# Altium schematic symbol library 13-Logic 数字 IC.SchLib: 324 symbols (part 13 of 30) (continued)
## TMS320F28335ZJZS_a
designator IC?
32-Bit 150MHz Digital Signal Processor (DSP)
part A pins: A8 ~{XRD} (out), A10 XCLKOUT (out), G13 XCLKIN (in), G14 X1 (in), H14 X2 (out), K1 ADCINA7 (in), K2 ADCINA6 (in), L1 ADCINA5 (in), L2 ADCINA4 (in), L3 ADCINA3 (in), L7 TEST2 (io), L11 ~{TRST} (in), M1 ADCINA2 (in), M2 ADCINA1 (in), M3 ADCINA0 (in), M4 ADCINB2 (in), M5 ADCINB4 (in), M6 ADCINB6 (in), M7 TEST1 (io), M12 TMS (in), M13 ~{XRS} (io), M14 TCK (in), N2 ADCLO (in), N3 ADCINB1 (in), N4 ADCINB3 (in), N5 ADCINB5 (in), N6 ADCINB7 (in), N7 EMU0 (io), N12 TDI (in), N13 TDO (out), P3 ADCINB0 (in), P4 ADCREFM (out), P5 ADCREFP (out), P6 ADCRESEXT (out), P7 ADCREFIN (out), P8 EMU1 (io)
part B pins: A6 GPIO44/XA4 (io), A7 GPIO41/XA1 (io), A9 GPIO34/ECAP1/XREADY (io), B2 GPIO31/CANTXA/XA17 (io), B6 GPIO45/XA5 (io), B7 GPIO42/XA2 (io), B8 GPIO37/ECAP2/~{XZCS7} (io), B9 GPIO35/SCITXDA/XR/~{W} (io), C1 GPIO29/SCITXDA/XA19 (io), C2 GPIO30/CANRXA/XA18 (io), C3 GPIO39/XA16 (io), C6 GPIO46/XA6 (io), C7 GPIO43/XA3 (io), C8 GPIO40/XA0/~{XWE1} (io), C9 GPIO36/SCIRXDA/~{XZCS0} (io), C10 GPIO38/~{XWE0} (io), D1 GPIO0/EPWM1A (io), D2 GPIO1/EPWM1B/ECAP6/MFSRB (io), D3 GPIO2/EPWM2A, D6 GPIO47/XA7 (io), D10 GPIO28/SCIRXDA/~{XZCS6} (io), E1 GPIO3/EPWM2B/ECAP5/MCLKRB (io), E2 GPIO4/EPWM3A (io), E3 GPIO5/EPWM3B/MFSRA/ECAP1 (io), F1 GPIO6/EPWM4A/EPWMSYNCI/EPWMSYNCO (io), F2 GPIO7/EPWM4B/MCLKRA/ECAP2 (io), F3 GPIO8/EPWM5A/CANTXB/~{ADCSOCAO} (io), G1 GPIO9/EPWM5B/SCITXDB/ECAP3 (io), G2 GPIO10/EPWM6A/CANRXB/~{ADCSOCBO} (io), G3 GPIO11/EPWM6B/SCIRXDB/ECAP4 (io), H1 GPIO12/~{TZ1}/CANTXB/MDXB (io), H2 GPIO13/~{TZ2}/CANRXB/MDRB (io), H3 GPIO14/~{TZ3}/~{XHOLD}/SCITXDB/MCLKXB (io), J1 GPIO15/~{TZ4}/~{XHOLDA}/SCIRXDB/MFSXB (io), J2 GPIO16/SPISIMOA/CANTXB/~{TZ5} (io), J3 GPIO17/SPISOMIA/CANRXB/~{TZ6} (io), L13 GPIO49/ECAP6/XD30 (io), L14 GPIO48/ECAP5/XD31 (io), M8 GPIO19/~{SPISTEA}/SCIRXDB/CANTXA (io), M9 GPIO22/EQEP1S/MCLKXA/SCITXDB (io), M10 GPIO25/ECAP2/EQEP2B/MDRB (io), M11 GPIO32/SDAA/EPWMSYNCI/~{ADSOCAO} (io), N8 GPIO18/SPICLKA/SCITXDB/CANRXA (io), N9 GPIO21/EQEP1B/MDRA/CANRXB (io), N10 GPIO24/ECAP1/EQEP2A/MDXB (io), N11 GPIO27/ECAP4/EQEP2S/MFSXB (io), P9 GPIO20/EQEP1A/MDXA/CANTXB (io), P10 GPIO23/EQEP1I/MFSXA/SCIRXDB (io), P11 GPIO26/ECAP3/EQEP2I/MCLKXB (io), P12 GPIO33/SCLA/EPWMSYNCO/~{ADCSOCBO} (io)
part C pins: A3 GPIO86/XA14 (io), A4 GPIO83/XA11 (io), A5 GPIO80/XA8 (io), A11 GPIO76/XD3 (io), A12 GPIO73/XD6 (io), B3 GPIO87/XA15 (io), B4 GPIO84/XA12 (io), B5 GPIO81/XA9 (io), B10 GPIO79/XD0 (io), B11 GPIO77/XD2 (io), B12 GPIO74/XD5 (io), B13 GPIO72/XD7 (io), C4 GPIO85/XA13 (io), C5 GPIO82/XA10 (io), C11 GPIO78/XD1 (io), C12 GPIO75/XD4 (io), C13 GPIO71/XD8 (io), C14 GPIO70/XD9 (io), D12 GPIO69/XD10 (io), D13 GPIO68/XD11 (io), D14 GPIO67/XD12 (io), E12 GPIO66/XD13 (io), E13 GPIO65/XD14 (io), E14 GPIO64/XD15 (io), F12 GPIO63/SCITXDC/XD16 (io), F13 GPIO62/SCIRXDC/XD17 (io), F14 GPIO61/MFSRB/XD18 (io), G12 GPIO60/MCLKRB/XD19 (io), H11 GPIO59/MFSRA/XD20 (io), H12 GPIO58/MCLKRA/XD21 (io), H13 GPIO57/~{SPISTEA}/XD22 (io), J12 GPIO56/SPICLKA/XD23 (io), J13 GPIO55/SPISOMIA/XD24 (io), J14 GPIO54/SPISIMOA/XD25 (io), K12 GPIO53/EQEP1I/XD26 (io), K13 GPIO52/EQEP1S/XD27 (io), K14 GPIO51/EQEP1B/XD28 (io), L12 GPIO50/EQEP1A/XD29 (io)
part D pins: A1 VSS (power), A2 VSS (power), A13 VDDIO (power), A14 VSS (power), B1 VDDIO (power), B14 VSS (power), D4 VDD (power), D5 VDD (power), D7 VDDIO (power), D8 VDD (power), D9 VDD (power), D11 VDDIO (power), E4 VDDIO (power), E11 VDD (power), F4 VDD (power), F6 VSS (power), F7 VSS (power), F8 VSS (power), F9 VSS (power), F11 VDD (power), G4 VDDIO (power), G6 VSS (power), G7 VSS (power), G8 VSS (power), G9 VSS (power), G11 VDDIO (power), H4 VDD (power), H6 VSS (power), H7 VSS (power), H8 VSS (power), H9 VSS (power), J4 VDD (power), J6 VSS (power), J7 VSS (power), J8 VSS (power), J9 VSS (power), J11 VDD (power), K3 VDD1A18 (out), K4 VDDA2 (power), K11 VDD (power), L4 VSS1AGND (power), L5 VDDAIO (power), L6 VDD2A18 (power), L8 VDD (power), L9 VDD3VFL (power), L10 VDDIO (power), N1 VSSAIO (power), N14 VDDIO (power), P1 VSSA2 (power), P2 VSS2AGND (power), P13 VSS (power), P14 VSS (power)

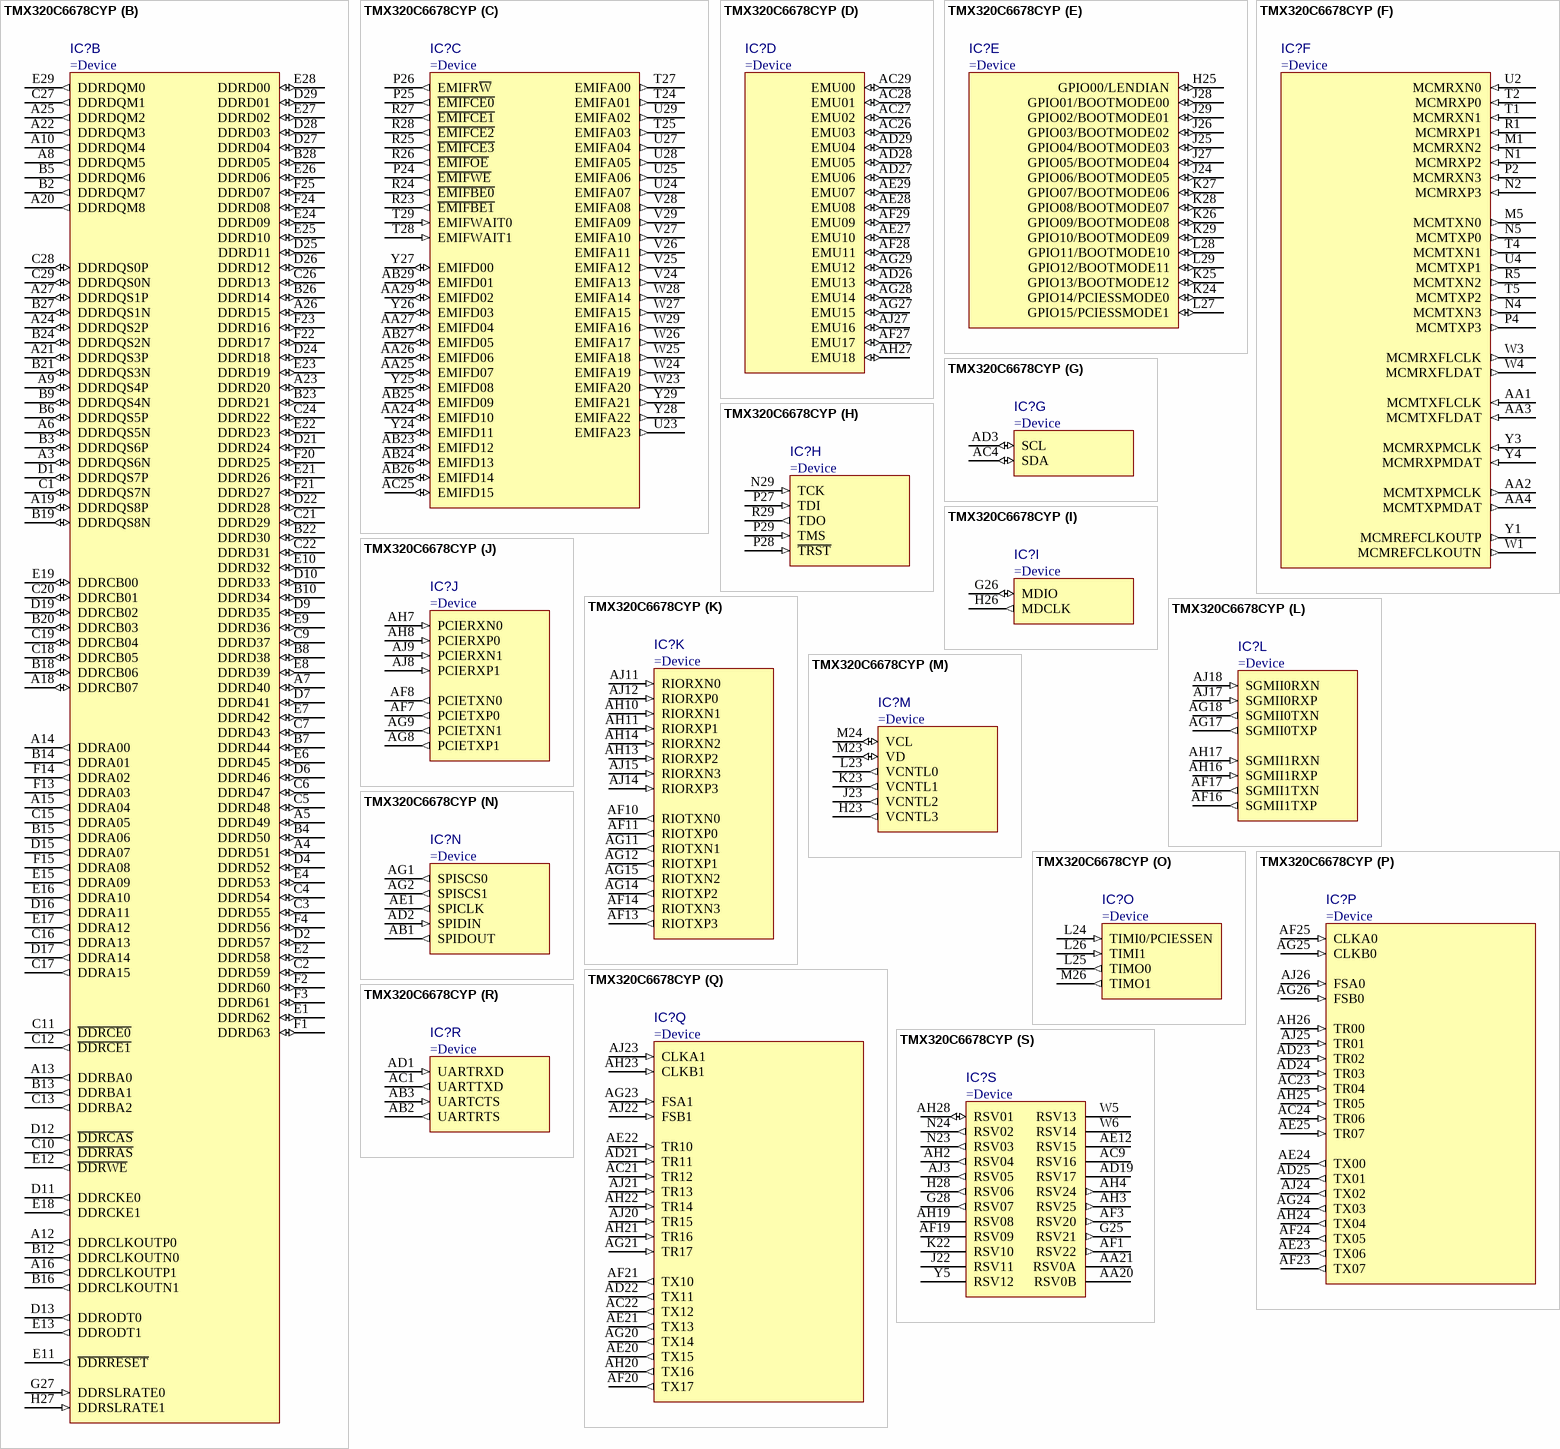
[diagram p82: symbol TMX320C6678CYP]

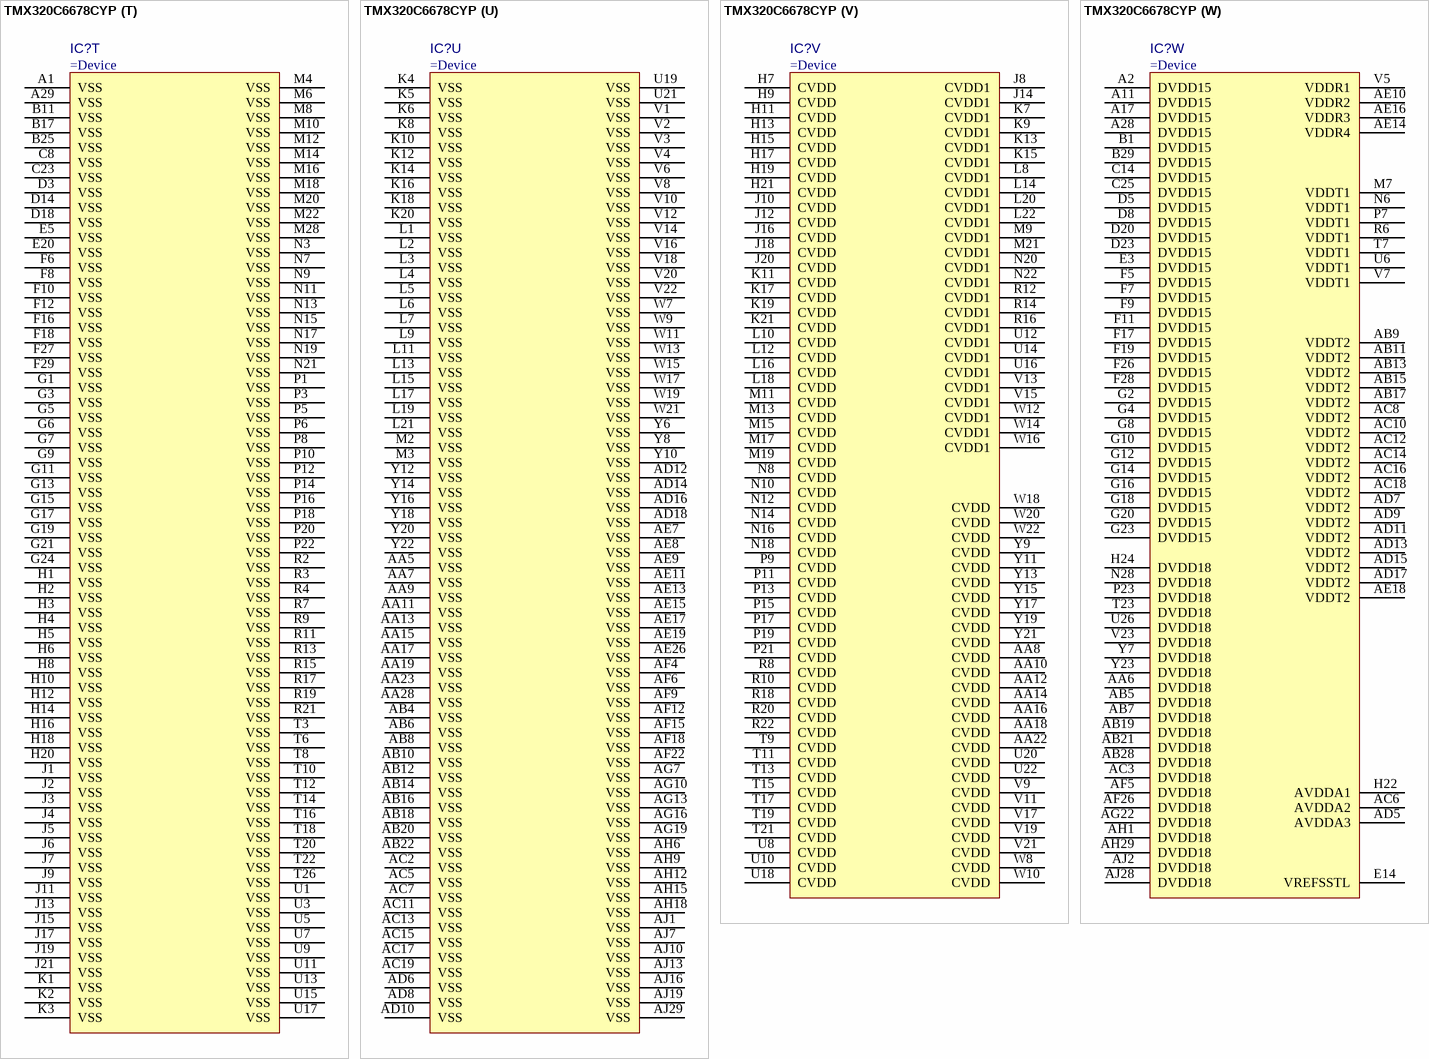
[diagram p83: symbol TMX320C6678CYP]

## TMX320C6678CYP
designator IC?
Multicore Fixed and Floating-Point Digital Signal Processor
part A pins: AC20 ~{POR} (in), AD4 CORESEL1 (in), AD20 HOUT (out), AE2 BOOTCOMPLETE (out), AE3 SYSCLKOUT (out), AE4 PACLKSEL (in), AE5 CORESEL3 (in), AE6 CORESEL2 (in), AF2 CORESEL0 (in), AG3 CORECLKP (in), AG4 CORECLKN (in), AG5 PCIECLKP (in), AG6 SRIOSGMIICLKP (in), AH5 PCIECLKN (in), AJ4 PASSCLKN (in), AJ5 PASSCLKP (in), AJ6 SRIOSGMIICLKN (in), G22 PTV15 (in), G29 DDRCLKP (in), H29 DDRCLKN (in), M25 ~{NMI} (in), M27 ~{LRESETNMIEN} (in), M29 ~{RESET} (in), N25 ~{RESETFULL} (in), N26 ~{LRESET} (in), N27 ~{RESETSTAT} (out), W2 MCMCLKP (in), Y2 MCMCLKN (in)
part B pins: A3 DDRDQS6N (io), A4 DDRD51 (io), A5 DDRD49 (io), A6 DDRDQS5N (io), A7 DDRD40 (io), A8 DDRDQM5 (out), A9 DDRDQS4P (io), A10 DDRDQM4 (out), A12 DDRCLKOUTP0 (out), A13 DDRBA0 (out), A14 DDRA00 (out), A15 DDRA04 (out), A16 DDRCLKOUTP1 (out), A18 DDRCB07 (io), A19 DDRDQS8P (io), A20 DDRDQM8 (out), A21 DDRDQS3P (io), A22 DDRDQM3 (out), A23 DDRD20 (io), A24 DDRDQS2P (io), A25 DDRDQM2 (out), A26 DDRD15 (io), A27 DDRDQS1P (io), B2 DDRDQM7 (out), B3 DDRDQS6P (io), B4 DDRD50 (io), B5 DDRDQM6 (out), B6 DDRDQS5P (io), B7 DDRD44 (io), B8 DDRD38 (io), B9 DDRDQS4N (io), B10 DDRD34 (io), B12 DDRCLKOUTN0 (out), B13 DDRBA1 (out), B14 DDRA01 (out), B15 DDRA06 (out), B16 DDRCLKOUTN1 (out), B18 DDRCB06 (io), B19 DDRDQS8N (io), B20 DDRCB03 (io), B21 DDRDQS3N (io), B22 DDRD30 (io), B23 DDRD21 (io), B24 DDRDQS2N (io), B26 DDRD14 (io), B27 DDRDQS1N (io), B28 DDRD05 (io), C1 DDRDQS7N (io), C2 DDRD59 (io), C3 DDRD55 (io), C4 DDRD54 (io), C5 DDRD48 (io), C6 DDRD47 (io), C7 DDRD43 (io), C9 DDRD37 (io), C10 ~{DDRRAS} (out), C11 ~{DDRCE0} (out), C12 ~{DDRCE1} (out), C13 DDRBA2 (out), C15 DDRA05 (out), C16 DDRA13 (out), C17 DDRA15 (out), C18 DDRCB05 (io), C19 DDRCB04 (io), C20 DDRCB01 (io), C21 DDRD29 (io), C22 DDRD31 (io), C24 DDRD22 (io), C26 DDRD13 (io), C27 DDRDQM1 (out), C28 DDRDQS0P (io), C29 DDRDQS0N (io), D1 DDRDQS7P (io), D2 DDRD57 (io), D4 DDRD52 (io), D6 DDRD46 (io), D7 DDRD41 (io), D9 DDRD35 (io), D10 DDRD33 (io), D11 DDRCKE0 (out), D12 ~{DDRCAS} (out), D13 DDRODT0 (out), D15 DDRA07 (out), D16 DDRA11 (out), D17 DDRA14 (out), D19 DDRCB02 (io), D21 DDRD24 (io), D22 DDRD28 (io), D24 DDRD18 (io), D25 DDRD11 (io), D26 DDRD12 (io), D27 DDRD04 (io), D28 DDRD03 (io), D29 DDRD01 (io), E1 DDRD62 (io), E2 DDRD58 (io), E4 DDRD53 (io), E6 DDRD45 (io), E7 DDRD42 (io), E8 DDRD39 (io), E9 DDRD36 (io), E10 DDRD32 (io), E11 ~{DDRRESET} (out), E12 ~{DDRWE} (out), E13 DDRODT1 (out), E15 DDRA09 (out), E16 DDRA10 (out), E17 DDRA12 (out), E18 DDRCKE1 (out), E19 DDRCB00 (io), E21 DDRD26 (io), E22 DDRD23 (io), E23 DDRD19 (io), E24 DDRD09 (io), E25 DDRD10 (io), E26 DDRD06 (io), E27 DDRD02 (io), E28 DDRD00 (io), E29 DDRDQM0 (out), F1 DDRD63 (io), F2 DDRD60 (io), F3 DDRD61 (io), F4 DDRD56 (io), F13 DDRA03 (out), F14 DDRA02 (out), F15 DDRA08 (out), F20 DDRD25 (io), F21 DDRD27 (io), F22 DDRD17 (io), F23 DDRD16 (io), F24 DDRD08 (io), F25 DDRD07 (io), G27 DDRSLRATE0 (in), H27 DDRSLRATE1 (in)
part C pins: AA24 EMIFD10 (io), AA25 EMIFD07 (io), AA26 EMIFD06 (io), AA27 EMIFD04 (io), AA29 EMIFD02 (io), AB23 EMIFD12 (io), AB24 EMIFD13 (io), AB25 EMIFD09 (io), AB26 EMIFD14 (io), AB27 EMIFD05 (io), AB29 EMIFD01 (io), AC25 EMIFD15 (io), P24 ~{EMIFWE} (out), P25 ~{EMIFCE0} (out), P26 EMIFR~{W} (out), R23 ~{EMIFBE1} (out), R24 ~{EMIFBE0} (out), R25 ~{EMIFCE3} (out), R26 ~{EMIFOE} (out), R27 ~{EMIFCE1} (out), R28 ~{EMIFCE2} (out), T24 EMIFA01 (out), T25 EMIFA03 (out), T27 EMIFA00 (out), T28 EMIFWAIT1 (in), T29 EMIFWAIT0 (in), U23 EMIFA23 (out), U24 EMIFA07 (out), U25 EMIFA06 (out), U27 EMIFA04 (out), U28 EMIFA05 (out), U29 EMIFA02 (out), V24 EMIFA13 (out), V25 EMIFA12 (out), V26 EMIFA11 (out), V27 EMIFA10 (out), V28 EMIFA08 (out), V29 EMIFA09 (out), W23 EMIFA20 (out), W24 EMIFA19 (out), W25 EMIFA18 (out), W26 EMIFA17 (out), W27 EMIFA15 (out), W28 EMIFA14 (out), W29 EMIFA16 (out), Y24 EMIFD11 (io), Y25 EMIFD08 (io), Y26 EMIFD03 (io), Y27 EMIFD00 (io), Y28 EMIFA22 (out), Y29 EMIFA21 (out)
part D pins: AC26 EMU03 (io), AC27 EMU02 (io), AC28 EMU01 (io), AC29 EMU00 (io), AD26 EMU13 (io), AD27 EMU06 (io), AD28 EMU05 (io), AD29 EMU04 (io), AE27 EMU10 (io), AE28 EMU08 (io), AE29 EMU07 (io), AF27 EMU17 (io), AF28 EMU11 (io), AF29 EMU09 (io), AG27 EMU15 (io), AG28 EMU14 (io), AG29 EMU12 (io), AH27 EMU18 (io), AJ27 EMU16 (io)
part E pins: H25 GPIO00/LENDIAN (io), J24 GPIO06/BOOTMODE05 (io), J25 GPIO04/BOOTMODE03 (io), J26 GPIO03/BOOTMODE02 (io), J27 GPIO05/BOOTMODE04 (io), J28 GPIO01/BOOTMODE00 (io), J29 GPIO02/BOOTMODE01 (io), K24 GPIO14/PCIESSMODE0 (io), K25 GPIO13/BOOTMODE12 (io), K26 GPIO09/BOOTMODE08 (io), K27 GPIO07/BOOTMODE06 (io), K28 GPIO08/BOOTMODE07 (io), K29 GPIO10/BOOTMODE09 (io), L27 GPIO15/PCIESSMODE1 (io), L28 GPIO11/BOOTMODE10 (io), L29 GPIO12/BOOTMODE11 (io)
part F pins: AA1 MCMTXFLCLK (in), AA2 MCMTXPMCLK (out), AA3 MCMTXFLDAT (in), AA4 MCMTXPMDAT (out), M1 MCMRXN2 (in), M5 MCMTXN0 (out), N1 MCMRXP2 (in), N2 MCMRXP3 (in), N4 MCMTXN3 (out), N5 MCMTXP0 (out), P2 MCMRXN3 (in), P4 MCMTXP3 (out), R1 MCMRXP1 (in), R5 MCMTXN2 (out), T1 MCMRXN1 (in), T2 MCMRXP0 (in), T4 MCMTXN1 (out), T5 MCMTXP2 (out), U2 MCMRXN0 (in), U4 MCMTXP1 (out), W1 MCMREFCLKOUTN (out), W3 MCMRXFLCLK (out), W4 MCMRXFLDAT (out), Y1 MCMREFCLKOUTP (out), Y3 MCMRXPMCLK (in), Y4 MCMRXPMDAT (in)
part G pins: AC4 SDA (io), AD3 SCL (io)
part H pins: N29 TCK (in), P27 TDI (in), P28 ~{TRST} (in), P29 TMS (in), R29 TDO (out)
part I pins: G26 MDIO (io), H26 MDCLK (out)
part J pins: AF7 PCIETXP0 (out), AF8 PCIETXN0 (out), AG8 PCIETXP1 (out), AG9 PCIETXN1 (out), AH7 PCIERXN0 (in), AH8 PCIERXP0 (in), AJ8 PCIERXP1 (in), AJ9 PCIERXN1 (in)
part K pins: AF10 RIOTXN0 (out), AF11 RIOTXP0 (out), AF13 RIOTXP3 (out), AF14 RIOTXN3 (out), AG11 RIOTXN1 (out), AG12 RIOTXP1 (out), AG14 RIOTXP2 (out), AG15 RIOTXN2 (out), AH10 RIORXN1 (in), AH11 RIORXP1 (in), AH13 RIORXP2 (in), AH14 RIORXN2 (in), AJ11 RIORXN0 (in), AJ12 RIORXP0 (in), AJ14 RIORXP3 (in), AJ15 RIORXN3 (in)
part L pins: AF16 SGMII1TXP (out), AF17 SGMII1TXN (out), AG17 SGMII0TXP (out), AG18 SGMII0TXN (out), AH16 SGMII1RXP (in), AH17 SGMII1RXN (in), AJ17 SGMII0RXP (in), AJ18 SGMII0RXN (in)
part M pins: H23 VCNTL3 (out), J23 VCNTL2 (out), K23 VCNTL1 (out), L23 VCNTL0 (out), M23 VD (io), M24 VCL (io)
part N pins: AB1 SPIDOUT (out), AD2 SPIDIN (in), AE1 SPICLK (out), AG1 SPISCS0 (out), AG2 SPISCS1 (out)
part O pins: L24 TIMI0/PCIESSEN (in), L25 TIMO0 (out), L26 TIMI1 (in), M26 TIMO1 (out)
part P pins: AC23 TR04 (in), AC24 TR06 (in), AD23 TR02 (in), AD24 TR03 (in), AD25 TX01 (out), AE23 TX06 (out), AE24 TX00 (out), AE25 TR07 (in), AF23 TX07 (out), AF24 TX05 (out), AF25 CLKA0 (in), AG24 TX03 (out), AG25 CLKB0 (in), AG26 FSB0 (in), AH24 TX04 (out), AH25 TR05 (in), AH26 TR00 (in), AJ24 TX02 (out), AJ25 TR01 (in), AJ26 FSA0 (in)
part Q pins: AC21 TR12 (in), AC22 TX12 (out), AD21 TR11 (in), AD22 TX11 (out), AE20 TX15 (out), AE21 TX13 (out), AE22 TR10 (in), AF20 TX17 (out), AF21 TX10 (out), AG20 TX14 (out), AG21 TR17 (in), AG23 FSA1 (in), AH20 TX16 (out), AH21 TR16 (in), AH22 TR14 (in), AH23 CLKB1 (in), AJ20 TR15 (in), AJ21 TR13 (in), AJ22 FSB1 (in), AJ23 CLKA1 (in)
part R pins: AB2 UARTRTS (out), AB3 UARTCTS (in), AC1 UARTTXD (out), AD1 UARTRXD (in)
part S pins: AA20 RSV0B, AA21 RSV0A, AC9 RSV16, AD19 RSV17, AE12 RSV15, AF1 RSV22 (out), AF3 RSV20 (out), AF19 RSV09, AH2 RSV04 (out), AH3 RSV25 (out), AH4 RSV24 (out), AH19 RSV08, AH28 RSV01 (io), AJ3 RSV05 (out), G25 RSV21 (out), G28 RSV07 (out), H28 RSV06 (out), J22 RSV11, K22 RSV10, N23 RSV03 (out), N24 RSV02 (out), W5 RSV13, W6 RSV14, Y5 RSV12
part T pins: A1 VSS (power), A29 VSS (power), B11 VSS (power), B17 VSS (power), B25 VSS (power), C8 VSS (power), C23 VSS (power), D3 VSS (power), D14 VSS (power), D18 VSS (power), E5 VSS (power), E20 VSS (power), F6 VSS (power), F8 VSS (power), F10 VSS (power), F12 VSS (power), F16 VSS (power), F18 VSS (power), F27 VSS (power), F29 VSS (power), G1 VSS (power), G3 VSS (power), G5 VSS (power), G6 VSS (power), G7 VSS (power), G9 VSS (power), G11 VSS (power), G13 VSS (power), G15 VSS (power), G17 VSS (power), G19 VSS (power), G21 VSS (power), G24 VSS (power), H1 VSS (power), H2 VSS (power), H3 VSS (power), H4 VSS (power), H5 VSS (power), H6 VSS (power), H8 VSS (power), H10 VSS (power), H12 VSS (power), H14 VSS (power), H16 VSS (power), H18 VSS (power), H20 VSS (power), J1 VSS (power), J2 VSS (power), J3 VSS (power), J4 VSS (power), J5 VSS (power), J6 VSS (power), J7 VSS (power), J9 VSS (power), J11 VSS (power), J13 VSS (power), J15 VSS (power), J17 VSS (power), J19 VSS (power), J21 VSS (power), K1 VSS (power), K2 VSS (power), K3 VSS (power), M4 VSS (power), M6 VSS (power), M8 VSS (power), M10 VSS (power), M12 VSS (power), M14 VSS (power), M16 VSS (power), M18 VSS (power), M20 VSS (power), M22 VSS (power), M28 VSS (power), N3 VSS (power), N7 VSS (power), N9 VSS (power), N11 VSS (power), N13 VSS (power), N15 VSS (power), N17 VSS (power), N19 VSS (power), N21 VSS (power), P1 VSS (power), P3 VSS (power), P5 VSS (power), P6 VSS (power), P8 VSS (power), P10 VSS (power), P12 VSS (power), P14 VSS (power), P16 VSS (power), P18 VSS (power), P20 VSS (power), P22 VSS (power), R2 VSS (power), R3 VSS (power), R4 VSS (power), R7 VSS (power), R9 VSS (power), R11 VSS (power), R13 VSS (power), R15 VSS (power), R17 VSS (power), R19 VSS (power), R21 VSS (power), T3 VSS (power), T6 VSS (power), T8 VSS (power), T10 VSS (power), T12 VSS (power), T14 VSS (power), T16 VSS (power), T18 VSS (power), T20 VSS (power), T22 VSS (power), T26 VSS (power), U1 VSS (power), U3 VSS (power), U5 VSS (power), U7 VSS (power), U9 VSS (power), U11 VSS (power), U13 VSS (power), U15 VSS (power), U17 VSS (power)
part U pins: AA5 VSS (power), AA7 VSS (power), AA9 VSS (power), AA11 VSS (power), AA13 VSS (power), AA15 VSS (power), AA17 VSS (power), AA19 VSS (power), AA23 VSS (power), AA28 VSS (power), AB4 VSS (power), AB6 VSS (power), AB8 VSS (power), AB10 VSS (power), AB12 VSS (power), AB14 VSS (power), AB16 VSS (power), AB18 VSS (power), AB20 VSS (power), AB22 VSS (power), AC2 VSS (power), AC5 VSS (power), AC7 VSS (power), AC11 VSS (power), AC13 VSS (power), AC15 VSS (power), AC17 VSS (power), AC19 VSS (power), AD6 VSS (power), AD8 VSS (power), AD10 VSS (power), AD12 VSS (power), AD14 VSS (power), AD16 VSS (power), AD18 VSS (power), AE7 VSS (power), AE8 VSS (power), AE9 VSS (power), AE11 VSS (power), AE13 VSS (power), AE15 VSS (power), AE17 VSS (power), AE19 VSS (power), AE26 VSS (power), AF4 VSS (power), AF6 VSS (power), AF9 VSS (power), AF12 VSS (power), AF15 VSS (power), AF18 VSS (power), AF22 VSS (power), AG7 VSS (power), AG10 VSS (power), AG13 VSS (power), AG16 VSS (power), AG19 VSS (power), AH6 VSS (power), AH9 VSS (power), AH12 VSS (power), AH15 VSS (power), AH18 VSS (power), AJ1 VSS (power), AJ7 VSS (power), AJ10 VSS (power), AJ13 VSS (power), AJ16 VSS (power), AJ19 VSS (power), AJ29 VSS (power), K4 VSS (power), K5 VSS (power), K6 VSS (power), K8 VSS (power), K10 VSS (power), K12 VSS (power), K14 VSS (power), K16 VSS (power), K18 VSS (power), K20 VSS (power), L1 VSS (power), L2 VSS (power), L3 VSS (power), L4 VSS (power), L5 VSS (power), L6 VSS (power), L7 VSS (power), L9 VSS (power), L11 VSS (power), L13 VSS (power), L15 VSS (power), L17 VSS (power), L19 VSS (power), L21 VSS (power), M2 VSS (power), M3 VSS (power), U19 VSS (power), U21 VSS (power), V1 VSS (power), V2 VSS (power), V3 VSS (power), V4 VSS (power), V6 VSS (power), V8 VSS (power), V10 VSS (power), V12 VSS (power), V14 VSS (power), V16 VSS (power), V18 VSS (power), V20 VSS (power), V22 VSS (power), W7 VSS (power), W9 VSS (power), W11 VSS (power), W13 VSS (power), W15 VSS (power), W17 VSS (power), W19 VSS (power), W21 VSS (power), Y6 VSS (power), Y8 VSS (power), Y10 VSS (power), Y12 VSS (power), Y14 VSS (power), Y16 VSS (power), Y18 VSS (power), Y20 VSS (power), Y22 VSS (power)
part V pins: AA8 CVDD (power), AA10 CVDD (power), AA12 CVDD (power), AA14 CVDD (power), AA16 CVDD (power), AA18 CVDD (power), AA22 CVDD (power), H7 CVDD (power), H9 CVDD (power), H11 CVDD (power), H13 CVDD (power), H15 CVDD (power), H17 CVDD (power), H19 CVDD (power), H21 CVDD (power), J8 CVDD1 (power), J10 CVDD (power), J12 CVDD (power), J14 CVDD1 (power), J16 CVDD (power), J18 CVDD (power), J20 CVDD (power), K7 CVDD1 (power), K9 CVDD1 (power), K11 CVDD (power), K13 CVDD1 (power), K15 CVDD1 (power), K17 CVDD (power), K19 CVDD (power), K21 CVDD (power), L8 CVDD1 (power), L10 CVDD (power), L12 CVDD (power), L14 CVDD1 (power), L16 CVDD (power), L18 CVDD (power), L20 CVDD1 (power), L22 CVDD1 (power), M9 CVDD1 (power), M11 CVDD (power), M13 CVDD (power), M15 CVDD (power), M17 CVDD (power), M19 CVDD (power), M21 CVDD1 (power), N8 CVDD (power), N10 CVDD (power), N12 CVDD (power), N14 CVDD (power), N16 CVDD (power), N18 CVDD (power), N20 CVDD1 (power), N22 CVDD1 (power), P9 CVDD (power), P11 CVDD (power), P13 CVDD (power), P15 CVDD (power), P17 CVDD (power), P19 CVDD (power), P21 CVDD (power), R8 CVDD (power), R10 CVDD (power), R12 CVDD1 (power), R14 CVDD1 (power), R16 CVDD1 (power), R18 CVDD (power), R20 CVDD (power), R22 CVDD (power), T9 CVDD (power), T11 CVDD (power), T13 CVDD (power), T15 CVDD (power), T17 CVDD (power), T19 CVDD (power), T21 CVDD (power), U8 CVDD (power), U10 CVDD (power), U12 CVDD1 (power), U14 CVDD1 (power), U16 CVDD1 (power), U18 CVDD (power), U20 CVDD (power), U22 CVDD (power), V9 CVDD (power), V11 CVDD (power), V13 CVDD1 (power), V15 CVDD1 (power), V17 CVDD (power), V19 CVDD (power), V21 CVDD (power), W8 CVDD (power), W10 CVDD (power), W12 CVDD1 (power), W14 CVDD1 (power), W16 CVDD1 (power), W18 CVDD (power), W20 CVDD (power), W22 CVDD (power), Y9 CVDD (power), Y11 CVDD (power), Y13 CVDD (power), Y15 CVDD (power), Y17 CVDD (power), Y19 CVDD (power), Y21 CVDD (power)
part W pins: A2 DVDD15 (power), A11 DVDD15 (power), A17 DVDD15 (power), A28 DVDD15 (power), AA6 DVDD18 (power), AB5 DVDD18 (power), AB7 DVDD18 (power), AB9 VDDT2 (power), AB11 VDDT2 (power), AB13 VDDT2 (power), AB15 VDDT2 (power), AB17 VDDT2 (power), AB19 DVDD18 (power), AB21 DVDD18 (power), AB28 DVDD18 (power), AC3 DVDD18 (power), AC6 AVDDA2 (power), AC8 VDDT2 (power), AC10 VDDT2 (power), AC12 VDDT2 (power), AC14 VDDT2 (power), AC16 VDDT2 (power), AC18 VDDT2 (power), AD5 AVDDA3 (power), AD7 VDDT2 (power), AD9 VDDT2 (power), AD11 VDDT2 (power), AD13 VDDT2 (power), AD15 VDDT2 (power), AD17 VDDT2 (power), AE10 VDDR2 (power), AE14 VDDR4 (power), AE16 VDDR3 (power), AE18 VDDT2 (power), AF5 DVDD18 (power), AF26 DVDD18 (power), AG22 DVDD18 (power), AH1 DVDD18 (power), AH29 DVDD18 (power), AJ2 DVDD18 (power), AJ28 DVDD18 (power), B1 DVDD15 (power), B29 DVDD15 (power), C14 DVDD15 (power), C25 DVDD15 (power), D5 DVDD15 (power), D8 DVDD15 (power), D20 DVDD15 (power), D23 DVDD15 (power), E3 DVDD15 (power), E14 VREFSSTL (power), F5 DVDD15 (power), F7 DVDD15 (power), F9 DVDD15 (power), F11 DVDD15 (power), F17 DVDD15 (power), F19 DVDD15 (power), F26 DVDD15 (power), F28 DVDD15 (power), G2 DVDD15 (power), G4 DVDD15 (power), G8 DVDD15 (power), G10 DVDD15 (power), G12 DVDD15 (power), G14 DVDD15 (power), G16 DVDD15 (power), G18 DVDD15 (power), G20 DVDD15 (power), G23 DVDD15 (power), H22 AVDDA1 (power), H24 DVDD18 (power), M7 VDDT1 (power), N6 VDDT1 (power), N28 DVDD18 (power), P7 VDDT1 (power), P23 DVDD18 (power), R6 VDDT1 (power), T7 VDDT1 (power), T23 DVDD18 (power), U6 VDDT1 (power), U26 DVDD18 (power), V5 VDDR1 (power), V7 VDDT1 (power), V23 DVDD18 (power), Y7 DVDD18 (power), Y23 DVDD18 (power)

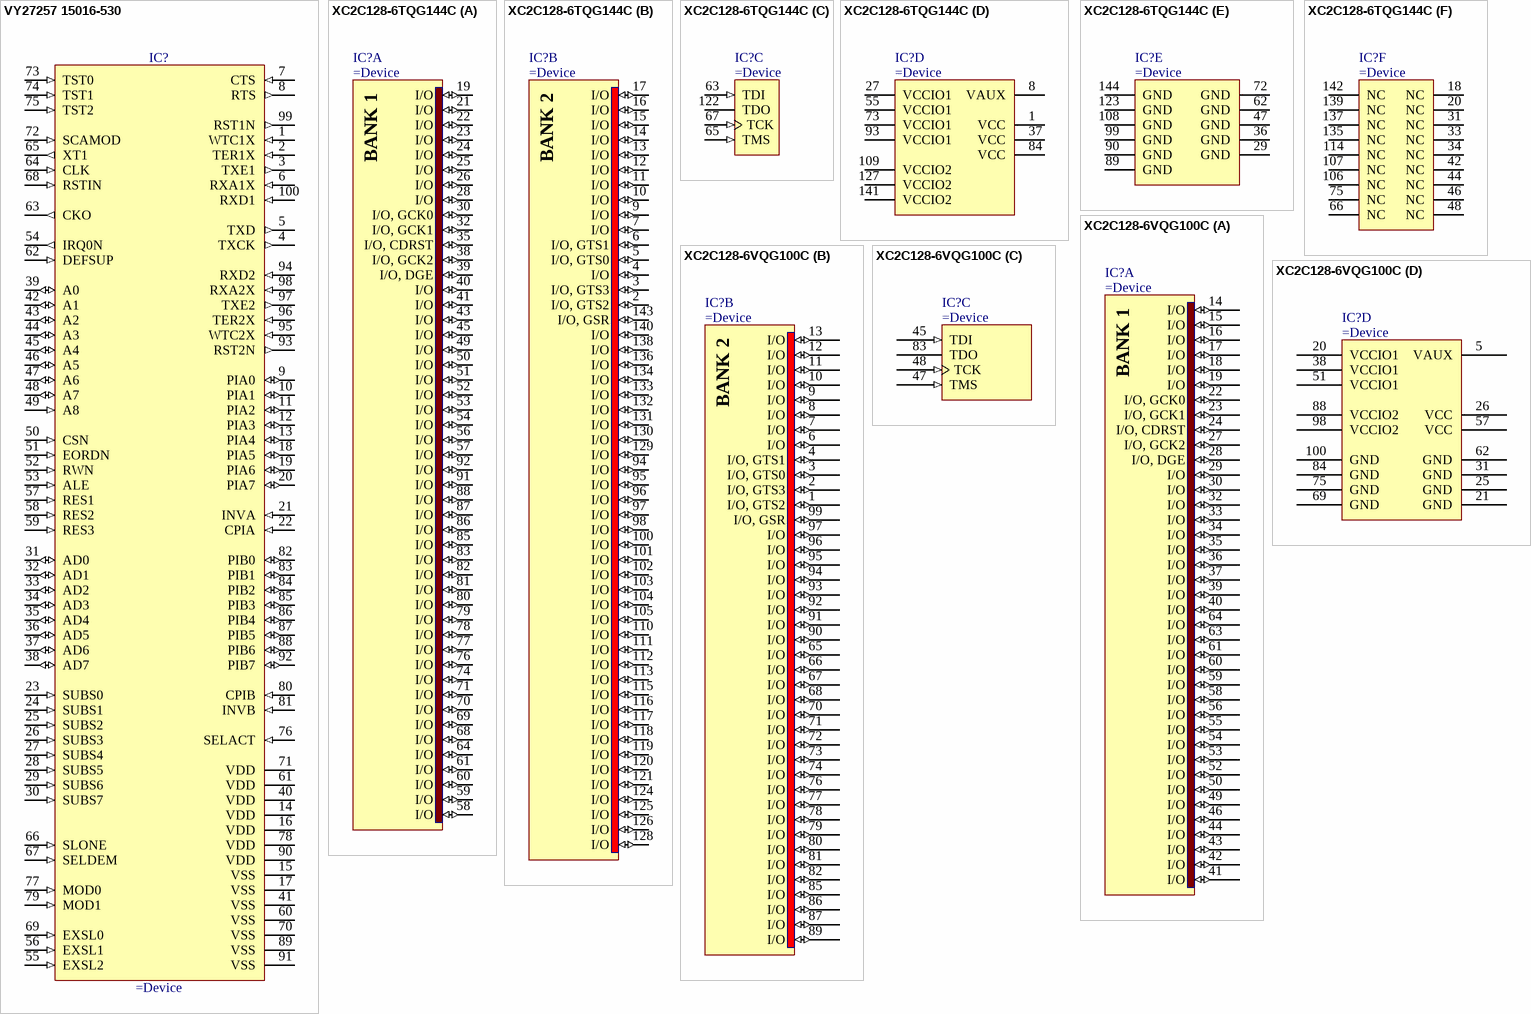
[diagram p84: symbols VY27257 15016-530 to XC2C128-6VQG100C]

## VY27257 15016-530
designator IC?
MICROFIP
pins: 1 WTC1X (in), 2 TER1X (in), 3 TXE1 (out), 4 TXCK (out), 5 TXD (out), 6 RXA1X (in), 7 CTS (in), 8 RTS (out), 9 PIA0 (io), 10 PIA1 (io), 11 PIA2 (io), 12 PIA3 (io), 13 PIA4 (io), 14 VDD (power), 15 VSS (power), 16 VDD (power), 17 VSS (power), 18 PIA5 (io), 19 PIA6 (io), 20 PIA7 (io), 21 INVA (in), 22 CPIA (in), 23 SUBS0 (in), 24 SUBS1 (in), 25 SUBS2 (in), 26 SUBS3 (in), 27 SUBS4 (in), 28 SUBS5 (in), 29 SUBS6 (in), 30 SUBS7 (in), 31 AD0 (io), 32 AD1 (io), 33 AD2 (io), 34 AD3 (io), 35 AD4 (io), 36 AD5 (io), 37 AD6 (io), 38 AD7 (io), 39 A0 (io), 40 VDD (power), 41 VSS (power), 42 A1 (io), 43 A2 (io), 44 A3 (io), 45 A4 (io), 46 A5 (io), 47 A6 (io), 48 A7 (io), 49 A8 (in), 50 CSN (in), 51 EORDN (in), 52 RWN (in), 53 ALE (in), 54 IRQ0N (out), 55 EXSL2 (in), 56 EXSL1 (in), 57 RES1 (in), 58 RES2 (in), 59 RES3 (in), 60 VSS (power), 61 VDD (power), 62 DEFSUP (in), 63 CKO (out), 64 CLK (in), 65 XT1 (out), 66 SLONE (in), 67 SELDEM (in), 68 RSTIN (in), 69 EXSL0 (in), 70 VSS (power), 71 VDD (power), 72 SCAMOD (in), 73 TST0 (in), 74 TST1 (in), 75 TST2 (in), 76 SELACT (in), 77 MOD0 (in), 78 VDD (power), 79 MOD1 (in), 80 CPIB (in), 81 INVB (in), 82 PIB0 (io), 83 PIB1 (io), 84 PIB2 (io), 85 PIB3 (io), 86 PIB4 (io), 87 PIB5 (io), 88 PIB6 (io), 89 VSS (power), 90 VDD (power), 91 VSS (power), 92 PIB7 (io), 93 RST2N (out), 94 RXD2 (in), 95 WTC2X (in), 96 TER2X (in), 97 TXE2 (out), 98 RXA2X (in), 99 RST1N (out), 100 RXD1 (in)

## XC2C128-6TQG144C
designator IC?
CoolRunner-II 1.8V, 128 Macrocell CPLD, 100 User I/Os, 144-Pin TQFP, Commercial Grade, Pb-Free
part A pins: 19 I/O (io), 21 I/O (io), 22 I/O (io), 23 I/O (io), 24 I/O (io), 25 I/O (io), 26 I/O (io), 28 I/O (io), 30 I/O, GCK0 (io), 32 I/O, GCK1 (io), 35 I/O, CDRST (io), 38 I/O, GCK2 (io), 39 I/O, DGE (io), 40 I/O (io), 41 I/O (io), 43 I/O (io), 45 I/O (io), 49 I/O (io), 50 I/O (io), 51 I/O (io), 52 I/O (io), 53 I/O (io), 54 I/O (io), 56 I/O (io), 57 I/O (io), 58 I/O (io), 59 I/O (io), 60 I/O (io), 61 I/O (io), 64 I/O (io), 68 I/O (io), 69 I/O (io), 70 I/O (io), 71 I/O (io), 74 I/O (io), 76 I/O (io), 77 I/O (io), 78 I/O (io), 79 I/O (io), 80 I/O (io), 81 I/O (io), 82 I/O (io), 83 I/O (io), 85 I/O (io), 86 I/O (io), 87 I/O (io), 88 I/O (io), 91 I/O (io), 92 I/O (io)
part B pins: 2 I/O, GTS2 (io), 3 I/O, GTS3 (io), 4 I/O (io), 5 I/O, GTS0 (io), 6 I/O, GTS1 (io), 7 I/O (io), 9 I/O (io), 10 I/O (io), 11 I/O (io), 12 I/O (io), 13 I/O (io), 14 I/O (io), 15 I/O (io), 16 I/O (io), 17 I/O (io), 94 I/O (io), 95 I/O (io), 96 I/O (io), 97 I/O (io), 98 I/O (io), 100 I/O (io), 101 I/O (io), 102 I/O (io), 103 I/O (io), 104 I/O (io), 105 I/O (io), 110 I/O (io), 111 I/O (io), 112 I/O (io), 113 I/O (io), 115 I/O (io), 116 I/O (io), 117 I/O (io), 118 I/O (io), 119 I/O (io), 120 I/O (io), 121 I/O (io), 124 I/O (io), 125 I/O (io), 126 I/O (io), 128 I/O (io), 129 I/O (io), 130 I/O (io), 131 I/O (io), 132 I/O (io), 133 I/O (io), 134 I/O (io), 136 I/O (io), 138 I/O (io), 140 I/O (io), 143 I/O, GSR (io)
part C pins: 63 TDI (in), 65 TMS (in), 67 TCK (in), 122 TDO
part D pins: 1 VCC (power), 8 VAUX (power), 27 VCCIO1 (power), 37 VCC (power), 55 VCCIO1 (power), 73 VCCIO1 (power), 84 VCC (power), 93 VCCIO1 (power), 109 VCCIO2 (power), 127 VCCIO2 (power), 141 VCCIO2 (power)
part E pins: 29 GND (power), 36 GND (power), 47 GND (power), 62 GND (power), 72 GND (power), 89 GND (power), 90 GND (power), 99 GND (power), 108 GND (power), 123 GND (power), 144 GND (power)
part F pins: 18 NC, 20 NC, 31 NC, 33 NC, 34 NC, 42 NC, 44 NC, 46 NC, 48 NC, 66 NC, 75 NC, 106 NC, 107 NC, 114 NC, 135 NC, 137 NC, 139 NC, 142 NC
part A text: BANK 1
part B text: BANK 2

## XC2C128-6VQG100C
designator IC?
CoolRunner-II 1.8V, 128 Macrocell CPLD, 80 User I/Os, 100-Pin VQFP, Commercial Grade, Pb-Free
part A pins: 14 I/O (io), 15 I/O (io), 16 I/O (io), 17 I/O (io), 18 I/O (io), 19 I/O (io), 22 I/O, GCK0 (io), 23 I/O, GCK1 (io), 24 I/O, CDRST (io), 27 I/O, GCK2 (io), 28 I/O, DGE (io), 29 I/O (io), 30 I/O (io), 32 I/O (io), 33 I/O (io), 34 I/O (io), 35 I/O (io), 36 I/O (io), 37 I/O (io), 39 I/O (io), 40 I/O (io), 41 I/O (io), 42 I/O (io), 43 I/O (io), 44 I/O (io), 46 I/O (io), 49 I/O (io), 50 I/O (io), 52 I/O (io), 53 I/O (io), 54 I/O (io), 55 I/O (io), 56 I/O (io), 58 I/O (io), 59 I/O (io), 60 I/O (io), 61 I/O (io), 63 I/O (io), 64 I/O (io)
part B pins: 1 I/O, GTS2 (io), 2 I/O, GTS3 (io), 3 I/O, GTS0 (io), 4 I/O, GTS1 (io), 6 I/O (io), 7 I/O (io), 8 I/O (io), 9 I/O (io), 10 I/O (io), 11 I/O (io), 12 I/O (io), 13 I/O (io), 65 I/O (io), 66 I/O (io), 67 I/O (io), 68 I/O (io), 70 I/O (io), 71 I/O (io), 72 I/O (io), 73 I/O (io), 74 I/O (io), 76 I/O (io), 77 I/O (io), 78 I/O (io), 79 I/O (io), 80 I/O (io), 81 I/O (io), 82 I/O (io), 85 I/O (io), 86 I/O (io), 87 I/O (io), 89 I/O (io), 90 I/O (io), 91 I/O (io), 92 I/O (io), 93 I/O (io), 94 I/O (io), 95 I/O (io), 96 I/O (io), 97 I/O (io), 99 I/O, GSR (io)
part C pins: 45 TDI (in), 47 TMS (in), 48 TCK (in), 83 TDO
part D pins: 5 VAUX (power), 20 VCCIO1 (power), 21 GND (power), 25 GND (power), 26 VCC (power), 31 GND (power), 38 VCCIO1 (power), 51 VCCIO1 (power), 57 VCC (power), 62 GND (power), 69 GND (power), 75 GND (power), 84 GND (power), 88 VCCIO2 (power), 98 VCCIO2 (power), 100 GND (power)
part A text: BANK 1
part B text: BANK 2

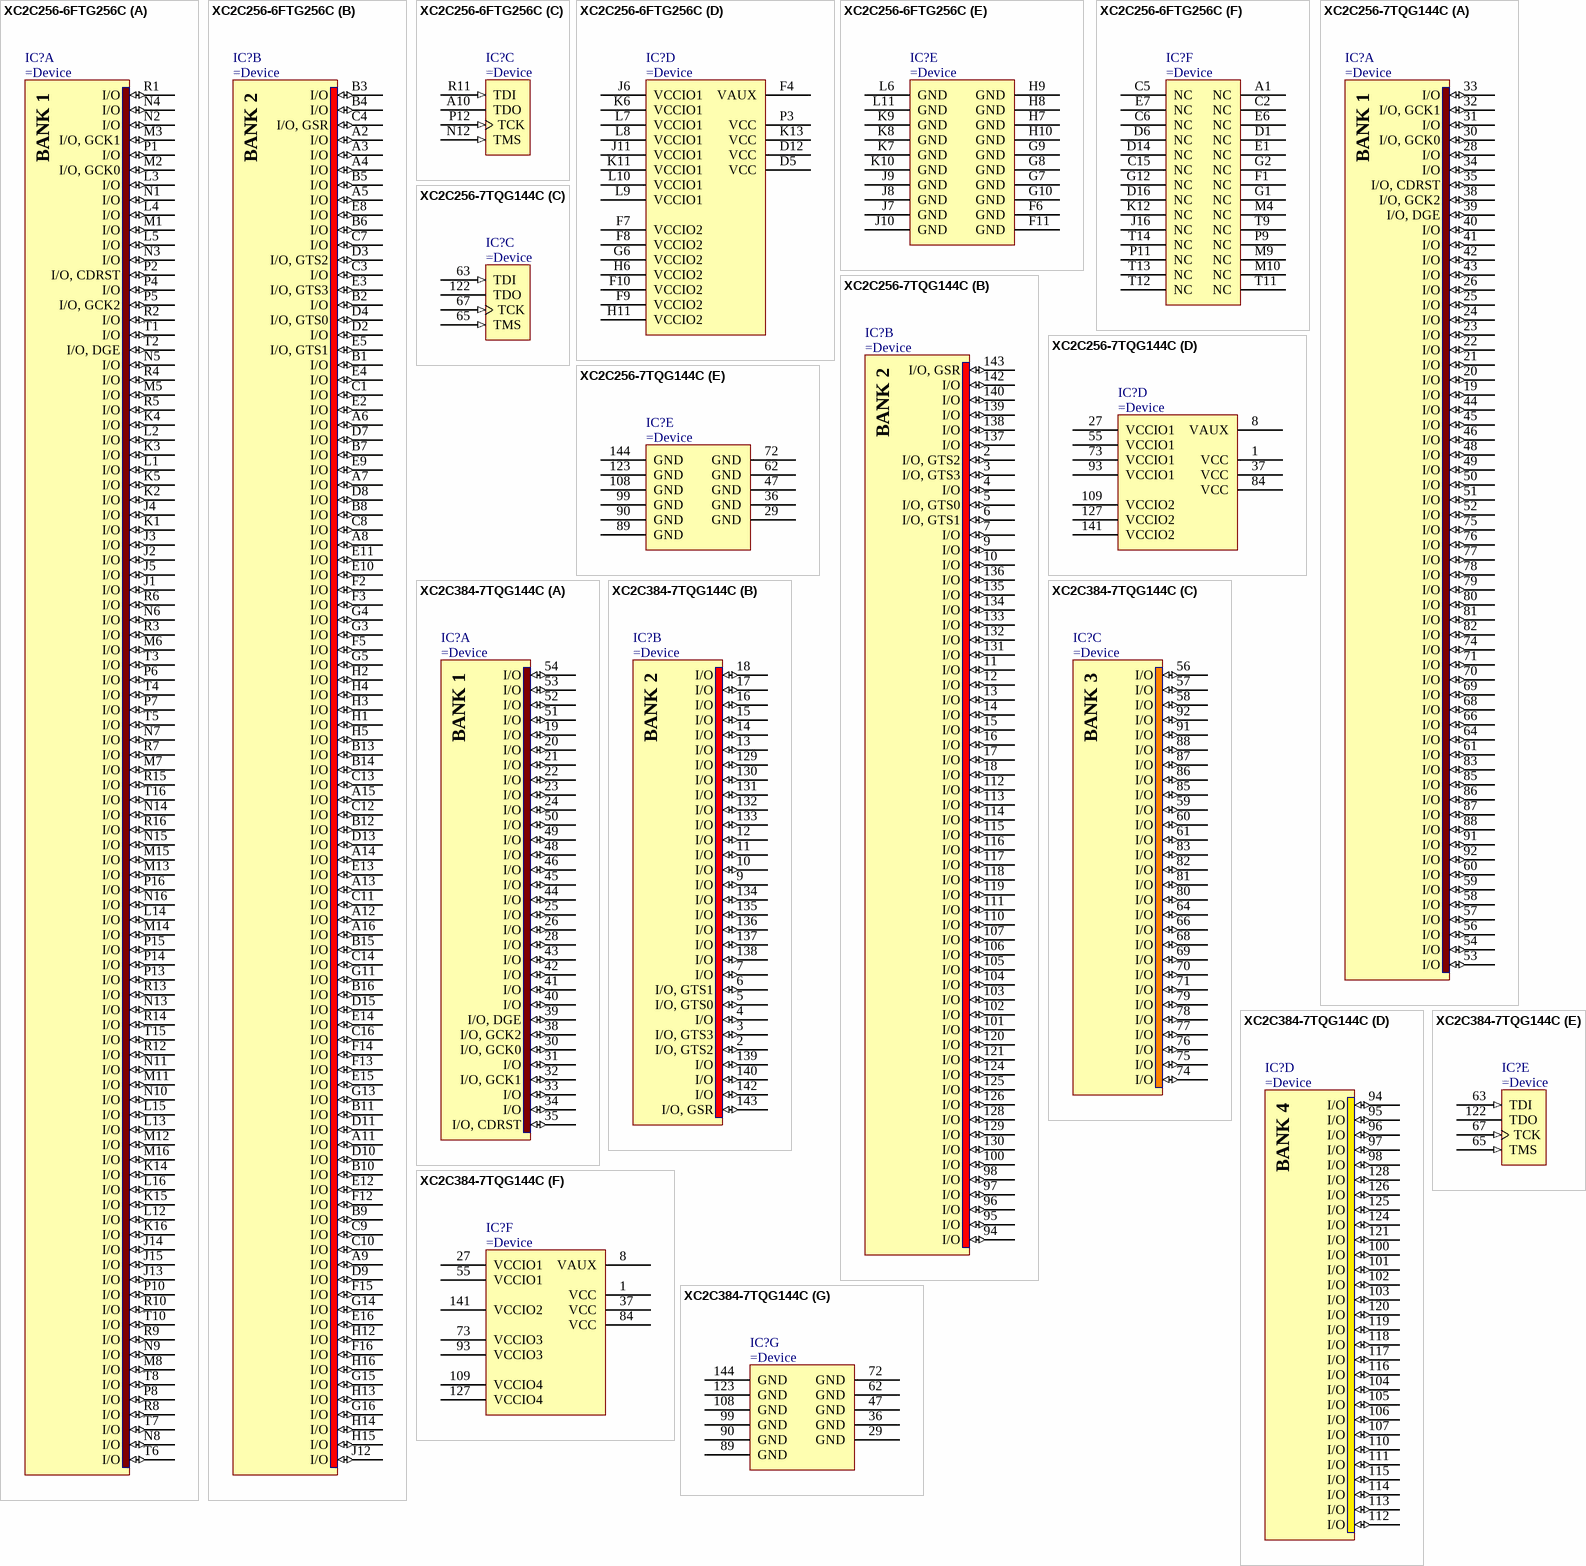
[diagram p85: symbols XC2C256-6FTG256C to XC2C384-7TQG144C]